# Altium schematic symbol library mastermind.SCHLIB: 732 symbols (part 2 of 5) (continued)
## GSM_SIM800C (continued)

## GSM_SIM800C_MODULE
designator U?, comment DeviceName: SIM800C  (hidden comment: SIM800C GSM/GPRS Module)
GateName_1: G$1; SymbolName_1: SIM900_LITERAL; DeviceSetName: GSM_SIM900_LITERAL; LibraryName: microbuilder; Package: SIM900_SMT; Parameter 1: *
footprint SIM800C_Module
pins: 1 5V, 2 VTTL, 3 GND, 4 TXD, 5 RXD, 6 DTR, 7 SPKRP, 8 SPKRN, 9 MICN, 10 MICP, 11 PI, 12 VRTC (power), 13 GND (power), 14 PWX, 15 GND, 16 VBAT

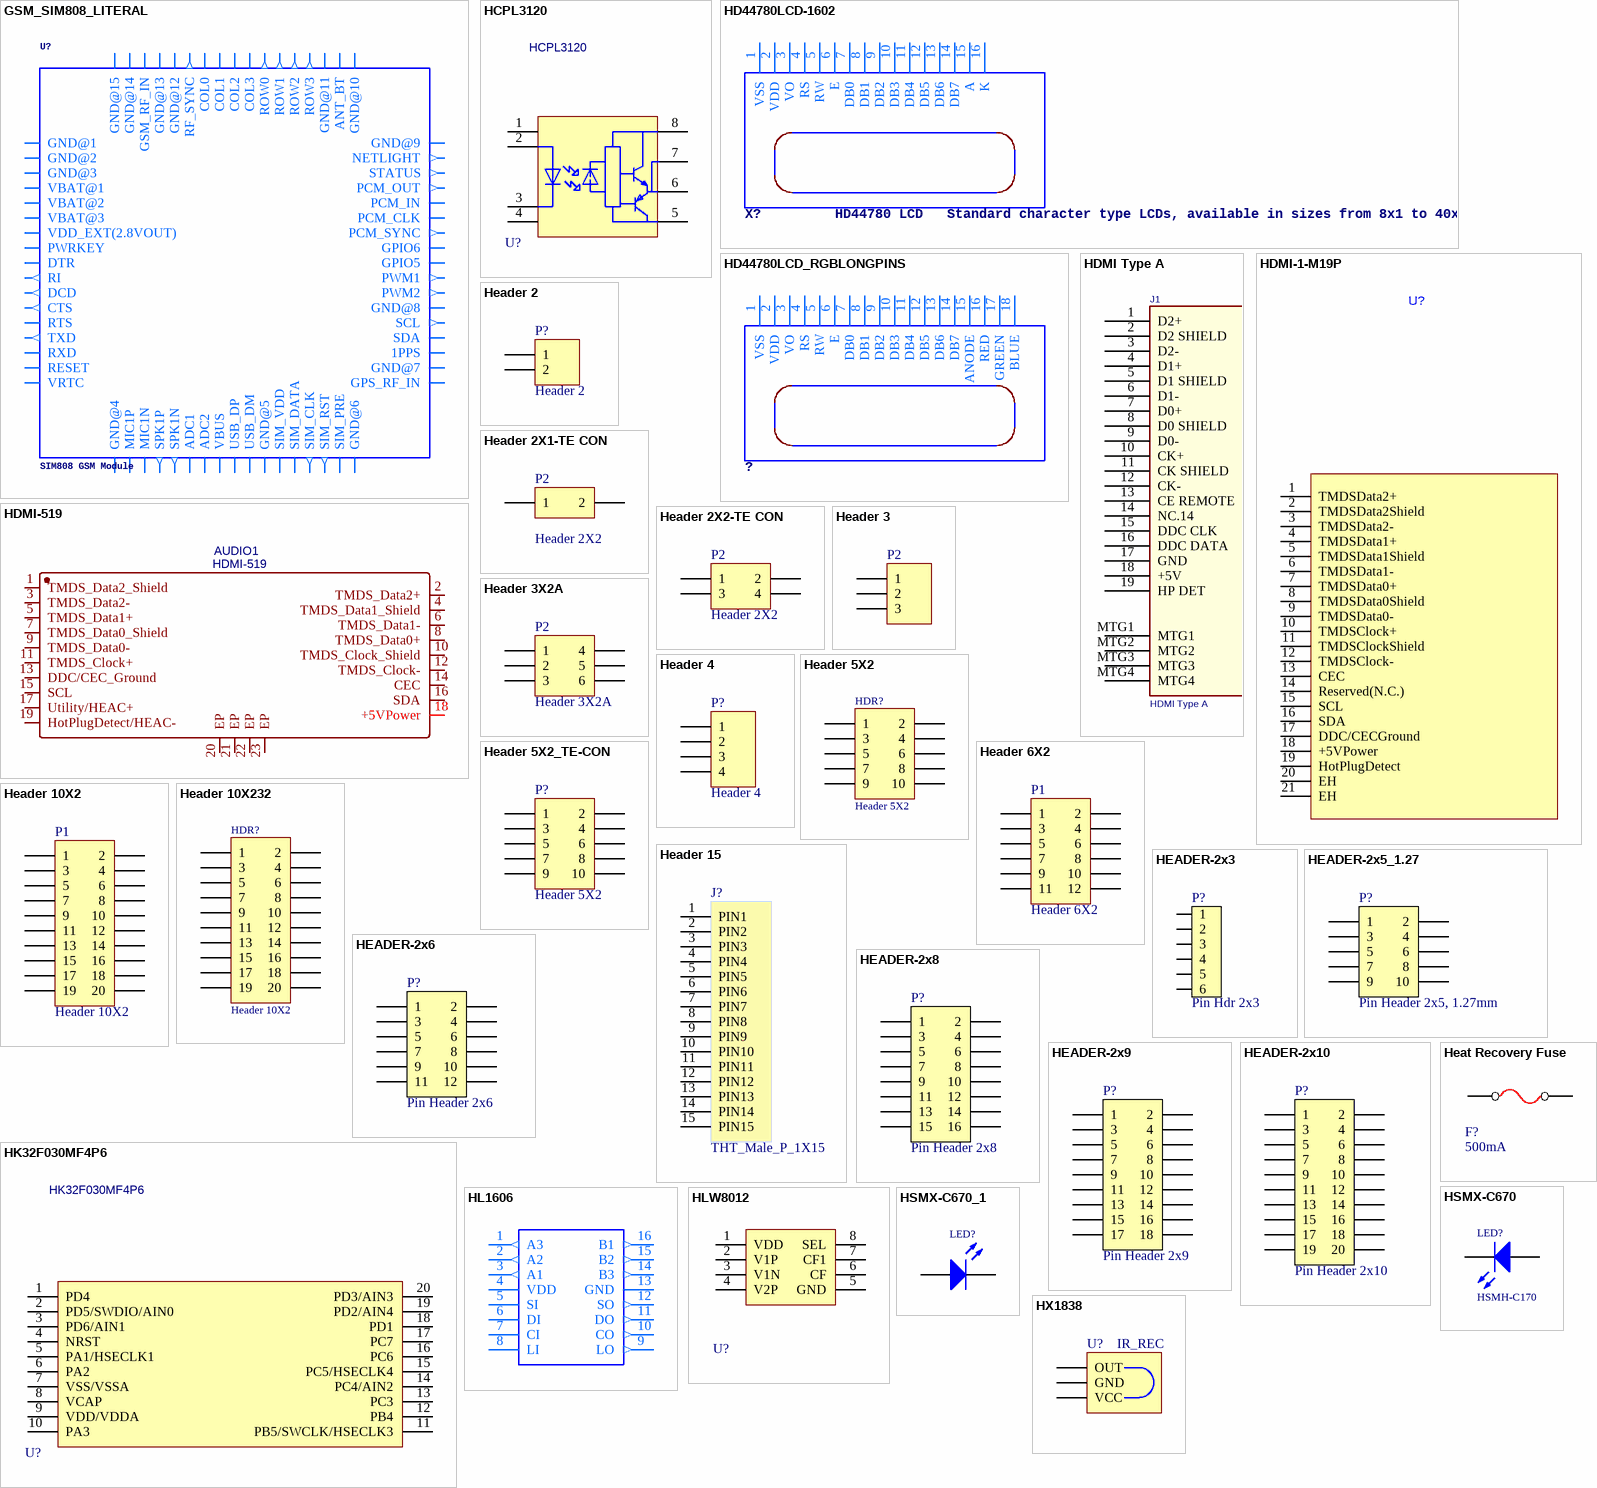
[diagram p12: symbols GSM_SIM808_LITERAL to HX1838]

## GSM_SIM808_LITERAL
designator U?, comment SIM808 GSM Module
footprint SIM900_SMT
pins: P$1 GND@1 (power), P$2 GND@2 (power), P$3 GND@3 (power), P$4 VBAT@1 (power), P$5 VBAT@2 (power), P$6 VBAT@3 (power), P$7 VDD_EXT(2.8VOUT) (power), P$8 PWRKEY, P$9 DTR, P$10 RI (out), P$11 DCD (out), P$12 CTS (out), P$13 RTS, P$14 TXD (out), P$15 RXD, P$16 RESET, P$17 VRTC (power), P$18 GND@4 (power), P$19 MIC1P, P$20 MIC1N, P$21 SPK1P (out), P$22 SPK1N (out), P$23 ADC1, P$24 ADC2, P$25 VBUS (power), P$26 USB_DP, P$27 USB_DM, P$28 GND@5 (power), P$29 SIM_VDD (power), P$30 SIM_DATA, P$31 SIM_CLK (out), P$32 SIM_RST (out), P$33 SIM_PRE, P$34 GND@6 (power), P$35 GPS_RF_IN, P$36 GND@7 (power), P$37 1PPS, P$38 SDA, P$39 SCL (out), P$40 GND@8 (power), P$41 PWM2 (out), P$42 PWM1 (out), P$43 GPIO5, P$44 GPIO6, P$45 PCM_SYNC (out), P$46 PCM_CLK, P$47 PCM_IN, P$48 PCM_OUT (out), P$49 STATUS (out), P$50 NETLIGHT (out), P$51 GND@9 (power), P$52 GND@10 (power), P$53 ANT_BT, P$54 GND@11 (power), P$55 ROW3 (out), P$56 ROW2 (out), P$57 ROW1 (out), P$58 ROW0 (out), P$59 COL3, P$60 COL2, P$61 COL1, P$62 COL0, P$63 RF_SYNC (out), P$64 GND@12 (power), P$65 GND@13 (power), P$66 GSM_RF_IN, P$67 GND@14 (power), P$68 GND@15 (power)

## HCPL3120
designator U?
Opto Gate Driver; Manufacturer: TOSHIBA; Manufacturer Part: TLP250(TP1,F); Supplier: LCSC; Supplier Part: C41664; spicePre: U; spiceSymbolName: TLP250(TP1,F)
footprint DIL08-ROUND
pins: 1, 2, 3, 4, 5 GND, 6, 7, 8 VCC

## HD44780LCD-1602
designator X?, comment HD44780 LCD   Standard character type LCDs, available in sizes from 8x1 to 40x4!
footprint LCD1602
pins: 1 VSS (oe), 2 VDD (oe), 3 VO, 4 RS, 5 RW, 6 E, 7 DB0, 8 DB1, 9 DB2, 10 DB3, 11 DB4, 12 DB5, 13 DB6, 14 DB7, 15 A, 16 K

## HD44780LCD_RGBLONGPINS
designator ?
footprint LCD1602-RGB
pins: 1 VSS (oe), 2 VDD (oe), 3 VO, 4 RS, 5 RW, 6 E, 7 DB0, 8 DB1, 9 DB2, 10 DB3, 11 DB4, 12 DB5, 13 DB6, 14 DB7, 15 ANODE, 16 RED, 17 GREEN, 18 BLUE

## HDMI Type A
designator J1
CONN RCPT 19POS HDMI RT ANG SMD; Manufacturer: Molex Connector Corporation; Manufacturer Part Number: 47151-0001; .Checked PCB: MM; Number of Positions: 19; Pitch: 0.50mm (.020"); Value: 47151-0001; Gender: Receptacle; .Version: V1.1 - Changed holes to slots; .Checked SCH: MM; Category: Connectors, Interconnects; Connector Type: HDMI; Family: USB, IEEE-1394 (Firewire), DVI, HDMI; Operating Temperature: -20°C to +85°C; Price 1k [$]: 1.74610; Supplier: Digikey; Supplier Part Number: WM19086CT-ND; Supplier 1: Digi-Key; Supplier Part Number 1: WM19086CT-ND; RoHS: RoHS Compliant; Stock 1: 2756; Pricing 1: 1=3.1, 10=2.57, 50=2.1456, 100=1.9034 (USD); Number of Contacts: 19; Specifications: -; Mounting Type: Surface Mount, Right Angle, Horizontal; Features: Detent Lock; Packaging: Cut Tape (CT); Ingress Protection: -; ComponentLink1URL: http://www.molex.com/pdm_docs/sd/471510001_sd.pdf; ComponentLink1Description: http://www.molex.com/pdm_docs/sd/471510001_sd.pdf
footprint HDMI Type-A
pins: 1 D2+, 2 D2 SHIELD, 3 D2-, 4 D1+, 5 D1 SHIELD, 6 D1-, 7 D0+, 8 D0 SHIELD, 9 D0-, 10 CK+, 11 CK SHIELD, 12 CK-, 13 CE REMOTE, 14 NC.14, 15 DDC CLK, 16 DDC DATA, 17 GND, 18 +5V, 19 HP DET, MTG1, MTG2, MTG3, MTG4

## HDMI-1-M19P
designator U?
footprint HDMI-SMD_BX-HDMI-1-M19P
pins: 1 TMDSData2+, 2 TMDSData2Shield, 3 TMDSData2-, 4 TMDSData1+, 5 TMDSData1Shield, 6 TMDSData1-, 7 TMDSData0+, 8 TMDSData0Shield, 9 TMDSData0-, 10 TMDSClock+, 11 TMDSClockShield, 12 TMDSClock-, 13 CEC, 14 Reserved(N.C.), 15 SCL, 16 SDA, 17 DDC/CECGround, 18 +5VPower, 19 HotPlugDetect, 20 EH, 21 EH

## HDMI-519
designator AUDIO1
Manufacturer: SOFNG(硕方); Contributor: LCSC; Supplier: LCSC; Supplier Part: C136421; Manufacturer Part: HDMI-519; JLCPCB Part Class: Extended Part; spicePre: A; spiceSymbolName: HDMI-519
footprint HDMI-SMD_19P-P0.40-H-F_HDMI-519
pins: 1 TMDS_Data2_Shield, 2 TMDS_Data2+, 3 TMDS_Data2-, 4 TMDS_Data1_Shield, 5 TMDS_Data1+, 6 TMDS_Data1-, 7 TMDS_Data0_Shield, 8 TMDS_Data0+, 9 TMDS_Data0-, 10 TMDS_Clock_Shield, 11 TMDS_Clock+, 12 TMDS_Clock-, 13 DDC/CEC_Ground, 14 CEC, 15 SCL, 16 SDA, 17 Utility/HEAC+, 18 +5VPower, 19 HotPlugDetect/HEAC-, 20 EP, 21 EP, 22 EP, 23 EP

## Header 2
designator P?
Header, 2-Pin; LatestRevisionDate: 17-Jul-2002; LatestRevisionNote: Re-released for DXP Platform.; Publisher: Altium Limited
footprint HDR1X2 (Connector; Header; 2 Position)
pins: 1, 2

## Header 2X1-TE CON
designator P2, comment Header 2X2
Header, 2-Pin, Dual row; LatestRevisionDate: 17-Jul-2002; LatestRevisionNote: Re-released for DXP Platform.; Publisher: Altium Limited
footprint HDR2X1-TE-CON (Connector; Header; 5x2 Position)
pins: 1, 2

## Header 2X2-TE CON
designator P2, comment Header 2X2
Header, 2-Pin, Dual row; LatestRevisionDate: 17-Jul-2002; LatestRevisionNote: Re-released for DXP Platform.; Publisher: Altium Limited
footprint HDR2X2-TE-CON (Connector; Header; 5x2 Position)
pins: 1, 2, 3, 4

## Header 3
designator P2  (value not drawn)
Header, 3-Pin; LatestRevisionDate: 17-Jul-2002; LatestRevisionNote: Re-released for DXP Platform.; Publisher: Altium Limited
footprint HDR1X3 (Connector; Header; 3 Position)
signal-integrity model Connector
footprint HDR1X3 - JUMP (Connector; Header; 3 Position)
pins: 1, 2, 3

## Header 3X2A
designator P2
Header, 3-Pin, Dual row; LatestRevisionDate: 17-Jul-2002; LatestRevisionNote: Re-released for DXP Platform.; Publisher: Altium Limited
signal-integrity model Connector
footprint HDR_2x3-SMD - 2.0
footprint HDR_2x3-SMD-2.54
footprint HDR2X3_1MM (Connector; Header; 3x2 Position)
pins: 1, 2, 3, 4, 5, 6

## Header 4
designator P?
Header, 4-Pin; LatestRevisionDate: 17-Jul-2002; LatestRevisionNote: Re-released for DXP Platform.; Publisher: Altium Limited
footprint JST-PH-4-THM
footprint 4PIN_SMD
footprint HDR1X4 (Connector; Header; 4 Position)
footprint HDR1X4 - 2mm (Connector; Header; 4 Position)
pins: 1, 2, 3, 4

## Header 5X2
designator HDR?
Header, 5-Pin, Dual row; Revision: 17-Jul-2002: Re-released for DXP Platform.
footprint HDR2X5_LP
signal-integrity model Connector
3D model 10_pin_box_male (PCB3D Model)
footprint DIP10_2SIDED
footprint IDC10_2SIDED
pins: 1, 2, 3, 4, 5, 6, 7, 8, 9, 10

## Header 5X2_TE-CON
designator P?, comment Header 5X2
Header, 5-Pin, Dual row TE  Connectivity; LatestRevisionDate: 17-Jul-2002; LatestRevisionNote: Re-released for DXP Platform.; Publisher: Altium Limited
footprint HDR2X5 (Connector; Header; 5x2 Position)
signal-integrity model Connector
pins: 1, 2, 3, 4, 5, 6, 7, 8, 9, 10

## Header 6X2
designator P1
Header, 6-Pin, Dual row; LatestRevisionDate: 17-Jul-2002; LatestRevisionNote: Re-released for DXP Platform.; Publisher: Altium Limited
footprint HDR2X6 (Connector; Header; 6x2 Position)
signal-integrity model Connector
footprint DIP12_2sided
footprint HDR_2x6 - SMD - 2.0
footprint HDR_2x6 - SMD - 2.54
footprint HDR2X6_2mm (Connector; Header; 6x2 Position)
pins: 1, 2, 3, 4, 5, 6, 7, 8, 9, 10, 11, 12

## Header 10X2
designator P1
Header, 10-Pin, Dual row; LatestRevisionDate: 17-Jul-2002; LatestRevisionNote: Re-released for DXP Platform.; Publisher: Altium Limited
footprint HDR2X10
signal-integrity model Connector
pins: 1, 2, 3, 4, 5, 6, 7, 8, 9, 10, 11, 12, 13, 14, 15, 16, 17, 18, 19, 20

## Header 10X232
designator HDR?, comment Header 10X2
Header, 10-Pin, Dual row; Revision: July-2002: Re-released for DXP Platform.
footprint HDR2X10
signal-integrity model Connector
3D model HDR10X2 (PCB3D Model)
pins: 1, 2, 3, 4, 5, 6, 7, 8, 9, 10, 11, 12, 13, 14, 15, 16, 17, 18, 19, 20

## Header 15
designator J?  Name: THT_Male_P_1X15
Header, 15-Pin; LatestRevisionDate: 17-Jul-2002; LatestRevisionNote: Re-released for DXP Platform.; Publisher: Altium Limited
footprint HDR1X15 (Connector; Header; 15 Position)
signal-integrity model Connector
pins: 1 PIN1, 2 PIN2, 3 PIN3, 4 PIN4, 5 PIN5, 6 PIN6, 7 PIN7, 8 PIN8, 9 PIN9, 10 PIN10, 11 PIN11, 12 PIN12, 13 PIN13, 14 PIN14, 15 PIN15

## HEADER-2x3
designator P?, comment Pin Hdr 2x3
Pin Header 2x3, 2.54mm (100mil) SMD; Part Number: Pin Header 2x3 SMD; Manufacturer: WCON; Manufacturer Part Number: 1125-1203S0M116R1; 2nd source part number: TSM-103-01-L-DV; Artikkelnr Noca: 55010007; Artikkelnr Simpro: N.A.; Datasheet: \\hizz\pro\app9717\Datasheet\connectores\W-CON\1125-12XXXXMXXXXX.PDF; Footprint Doc: HDR_2x3-SMD; LatestRevisionDate: 2016-01-22; Pin Count: 6; Publisher: Nordic Semiconductor; Published: 2016-01-22; Value: Pin Hdr 2x3; Note: SMD; Supplier: Cabcon; Supplier part number: 1125-1203S0M116R1; 2nd source Supplier: Samtec
footprint HDR_2x3-SMD
pins: 1, 2, 3, 4, 5, 6

## HEADER-2x5_1.27
designator P?, comment Pin Header 2x5, 1.27mm
Pin Header 2x5, 1.27mm (50mil), SMD, Keying Shroud; Part Number: Pin Header 2x5 SMD, 1.27mm, KS; Manufacturer: WCON; Manufacturer Part Number: 3132-10MS0BK00R1; 2nd source part number: FTSH-105-01-F-DV-K; Artikkelnr Noca: 55010009; Artikkelnr Simpro: N.A.; Datasheet: \\hizz\pro\app9717\Datasheet\connectores\W-CON\3132-XXMXXBK00XX.pdf; Footprint Doc: HDR_2x5-SMD-1.27mm; LatestRevisionDate: 2016-04-21; Pin Count: 10; Publisher: Nordic Semiconductor; Published: 2016-01-22; Value: Pin Header 2x5, 1.27mm; Note: *; Supplier: Cabcon; Supplier part number: 3132-10MS0BK00R1; 2nd source Supplier: Samtec
footprint HDR_2x5-SMD-1.27mm-K
pins: 1, 2, 3, 4, 5, 6, 7, 8, 9, 10

## HEADER-2x6
designator P?, comment Pin Header 2x6
Pin Header 2x6, 2.54mm (100mil); Note: Not mounted; Artikkelnr Noca: N.A.; Part Number: Pin Header 2x6; Manufacturer: *; Manufacturer Part Number: *; Datasheet: *; Footprint Doc: HDR_2x6; LatestRevisionDate: 2014-07-04; Pin Count: 12; Publisher: Nordic Semiconductor; Published: 2009-12-12; Value: Pin Header 2x6; Supplier: *; Supplier part number: *; 2nd source Supplier: *; 2nd source part number: *; Artikkelnr Simpro: N.A.
footprint HDR_2x6
pins: 1, 2, 3, 4, 5, 6, 7, 8, 9, 10, 11, 12

## HEADER-2x8
designator P?, comment Pin Header 2x8
Pin Header 2x8, 2.54mm (100mil); Note: Not mounted; Artikkelnr Noca: N.A.; Part Number: Pin Header 2x8; Manufacturer: *; Manufacturer Part Number: *; Datasheet: *; Footprint Doc: HDR_2x8; LatestRevisionDate: 2009-12-12; Pin Count: 16; Publisher: Nordic Semiconductor; Published: 2009-12-12; Value: Pin Header 2x8; Supplier: *; Supplier part number: *; 2nd source Supplier: *; 2nd source part number: *; Artikkelnr Simpro: N.A.
footprint HDR_2x8
pins: 1, 2, 3, 4, 5, 6, 7, 8, 9, 10, 11, 12, 13, 14, 15, 16

## HEADER-2x9
designator P?, comment Pin Header 2x9
Pin Header 2x9, 2.54mm (100mil); Artikkelnr Noca: N.A.; Part Number: Pin Header 2x9; Manufacturer: *; Manufacturer Part Number: *; Datasheet: *; Footprint Doc: HDR_2x9; LatestRevisionDate: 2011-07-06; Pin Count: 18; Publisher: Nordic Semiconductor; Published: 2011-07-06; Value: Pin Header 2x9; Note: *; Supplier: *; Supplier part number: *; 2nd source Supplier: *; 2nd source part number: *; Artikkelnr Simpro: N.A.
footprint HDR_2x9
pins: 1, 2, 3, 4, 5, 6, 7, 8, 9, 10, 11, 12, 13, 14, 15, 16, 17, 18

## HEADER-2x10
designator P?, comment Pin Header 2x10
Pin Header 2x10, 2.54mm (100mil); Note: Not mounted; Artikkelnr Noca: N.A.; Part Number: Pin Header 2x10; Manufacturer: *; Manufacturer Part Number: *; Datasheet: *; Footprint Doc: HDR_2x10; LatestRevisionDate: 2014-07-04; Pin Count: 20; Publisher: Nordic Semiconductor; Published: 2009-12-12; Value: Pin Header 2x10; Supplier: *; Supplier part number: *; 2nd source Supplier: *; 2nd source part number: *; Artikkelnr Simpro: N.A.
footprint HDR_2x10
pins: 1, 2, 3, 4, 5, 6, 7, 8, 9, 10, 11, 12, 13, 14, 15, 16, 17, 18, 19, 20

## Heat Recovery Fuse
designator F?  value 500mA
footprint 0411V
footprint FUSE
footprint FUSE - Long
footprint 0207/2V
footprint Fuse-SMD
footprint 1812
footprint R1206-NO
pins: 1, 2

## HK32F030MF4P6
designator U?
Manufacturer: HK(航顺); Contributor: LCSC; Supplier: LCSC; Supplier Part: C707444; Manufacturer Part: HK32F030MF4P6; JLCPCB Part Class: Extended Part; spicePre: U; spiceSymbolName: HK32F030MF4P6
footprint TSSOP-20_L6.5-W4.4-P0.65-LS6.4-BL
pins: 1 PD4, 2 PD5/SWDIO/AIN0, 3 PD6/AIN1, 4 NRST, 5 PA1/HSECLK1, 6 PA2, 7 VSS/VSSA, 8 VCAP, 9 VDD/VDDA, 10 PA3, 11 PB5/SWCLK/HSECLK3, 12 PB4, 13 PC3, 14 PC4/AIN2, 15 PC5/HSECLK4, 16 PC6, 17 PC7, 18 PD1, 19 PD2/AIN4, 20 PD3/AIN3

## HL1606
designator ?
footprint SO16
pins: 1 A3 (out), 2 A2 (out), 3 A1 (out), 4 VDD (power), 5 SI, 6 DI, 7 CI, 8 LI, 9 LO (out), 10 CO (out), 11 DO (out), 12 SO (out), 13 GND (power), 14 B3 (out), 15 B2 (out), 16 B1 (out)

## HLW8012
designator U?
footprint SOP8
pins: 1 VDD (power), 2 V1P, 3 V1N, 4 V2P, 5 GND, 6 CF, 7 CF1, 8 SEL (power)

## HSMX-C670
designator LED?, comment HSMH-C170
Typical RED GaAs SMD LED Agilent make; AEMS Code: 2610081; Revision: July-2002: Re-released for DXP Platform.
footprint SMD _LED
simulation model LED1 (Diode)
3D model LED (PCB3D Model)
pins: 1 A, 2 K

## HSMX-C670_1
designator LED?, comment HSMH-C170  (value not drawn)
Typical RED GaAs SMD LED Agilent make; AEMS Code: 2610081; Revision: July-2002: Re-released for DXP Platform.
footprint SMD _LED
simulation model LED1 (Diode)
3D model LED (PCB3D Model)
pins: 1 A, 2 K

## HX1838
designator U?
Header, 3-Pin; LatestRevisionDate: 17-Jul-2002; LatestRevisionNote: Re-released for DXP Platform.; Publisher: Altium Limited
footprint ISO203 (Connector; Header; 3 Position)
pins: 1 OUT, 2 GND, 3 VCC
text: IR_REC

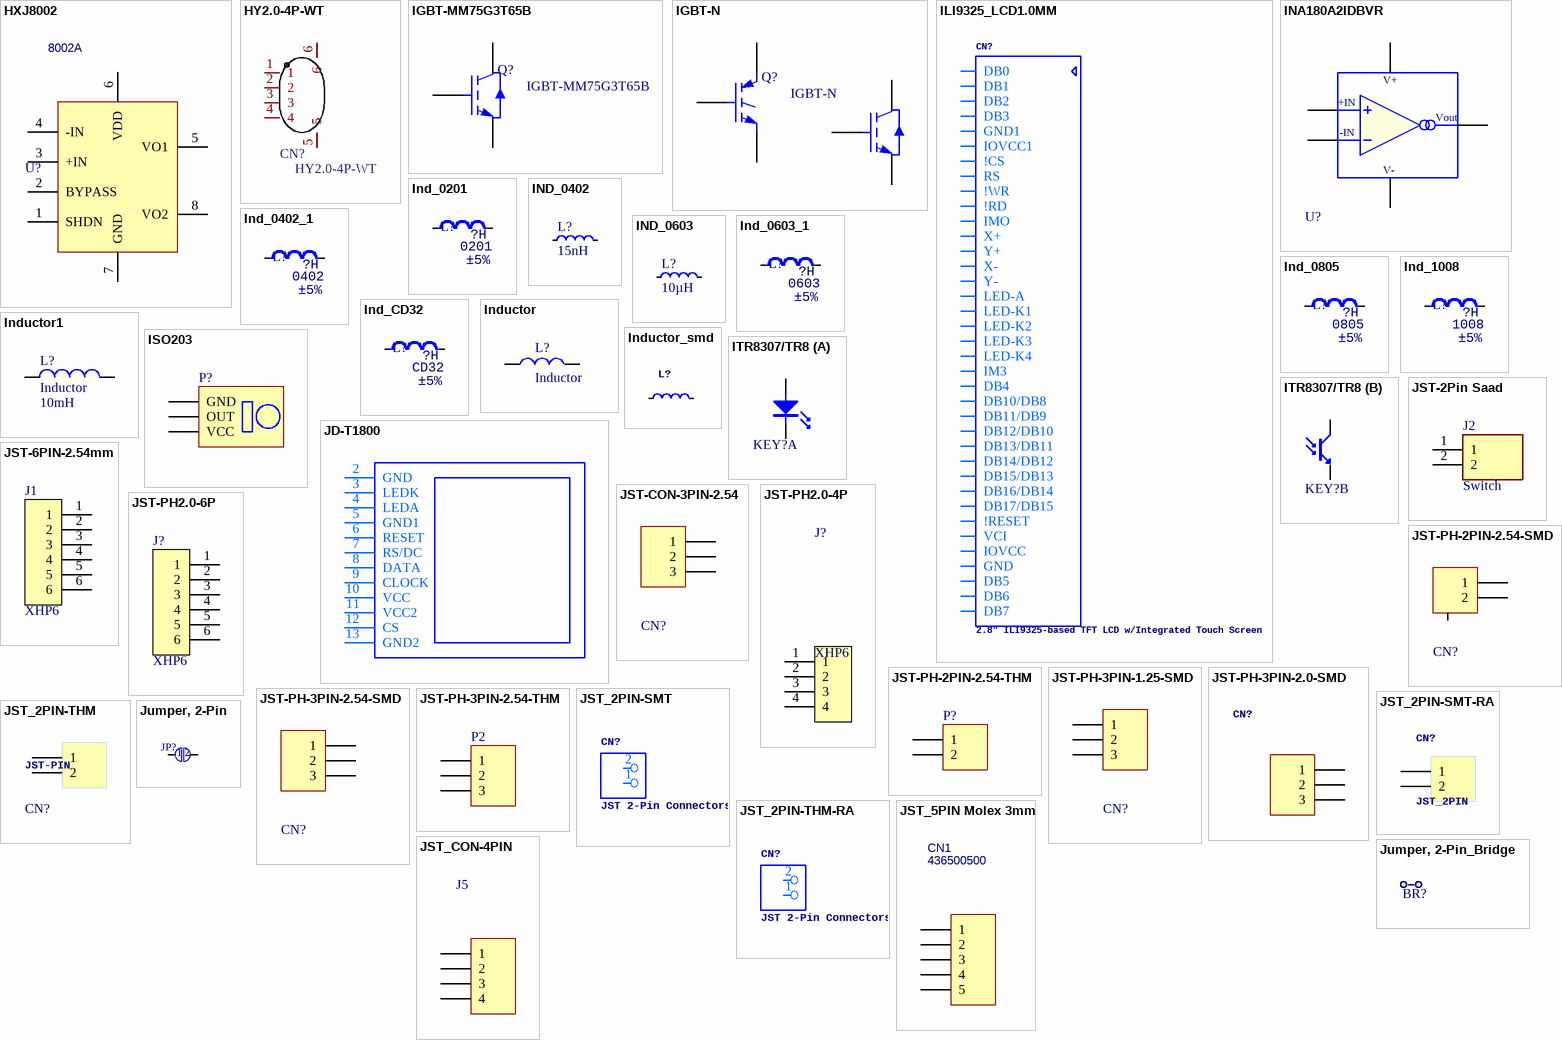
[diagram p13: symbols HXJ8002 to Jumper, 2-Pin_Bridge]

## HXJ8002
designator U?, comment 8002A
Manufacturer: IDCHIP(英锐芯); Contributor: LCSC; Supplier: LCSC; Supplier Part: C329448; Manufacturer Part: 8002A; JLCPCB Part Class: Extended Part; spicePre: U; spiceSymbolName: 8002A
footprint SOIC-8E (SOIC, 8-Leads, Body 4.90x3.90mm, Pitch 1.27mm, IPC Medium Density)
pins: 1 SHDN, 2 BYPASS, 3 +IN, 4 -IN, 5 VO1, 6 VDD, 7 GND, 8 VO2

## HY2.0-4P-WT
designator CN?
Manufacturer: CAX(创都); Add into BOM: yes; Pins Structure: 1x4P; Pitch: 2mm; Number of PINs Per Row: 4; Symbol: HY2.0-4P-WT; Device: HY2.0-4P-WT; Supplier: LCSC; Supplier Part: C722729; Manufacturer Part: HY2.0-4P-WT; JLCPCB Part Class: Extended Part; LCSC Part Name: 1x4P 间距:2mm 卧贴; Supplier Footprint: SMD,P=2mm,卧贴; Datasheet: https://atta.szlcsc.com/upload/public/pdf/source/20200903/C722727_BBF50559C2ABBA609D4F52DD7C381BF6.pdf; Convert to PCB: yes; Mounting Style: 卧贴; Reference Series: -; Number of Pins: 4P; Number of Rows: 1; Row Spacing: -; Current Rating (Max): -; Operating Temperature Range: -
footprint CONN-SMD_HY2.0-4P
pins: 1, 2, 3, 4, 5, 6

## IGBT-MM75G3T65B
designator Q?
N-Channel  650V 75A; Published: 8-Jun-2000; LatestRevisionDate: 17-Jul-2002; LatestRevisionNote: Re-released for DXP Platform.; DatasheetVersion: PD-9.684A; PackageReference: TO-247; Publisher: Altium Limited; PackageDescription: SIP with Mounting Hole; 3 Leads; Body 20 x 15.6 x 5 mm (typ); Pitch 5.45 mm; Code_JEDEC: TO-247-AC; ComponentLink1Description: Manufacturer Link; ComponentLink1URL: http://www.irf.com/
footprint TO-247 (SIP with Mounting Hole; 3 Leads; Body 20 x 15.6 x 5 mm (typ); Pitch 5.45 mm)
pins: 1 G, 2 C, 3 E

## IGBT-N
designator Q?
Insulated Gate Bipolar Transistor (N-Channel); Published: 8-Jun-2000; LatestRevisionDate: 17-Jul-2002; LatestRevisionNote: Re-released for DXP Platform.; DatasheetVersion: PD-9.684A; PackageReference: TO-247; Publisher: Altium Limited; PackageDescription: SIP with Mounting Hole; 3 Leads; Body 20 x 15.6 x 5 mm (typ); Pitch 5.45 mm; Code_JEDEC: TO-247-AC; ComponentLink1Description: Manufacturer Link; ComponentLink1URL: http://www.irf.com/
pins: 1 G, 1 G, 2 C, 2 C, 3 E, 3 E

## ILI9325_LCD1.0MM
designator CN?, comment 2.8" ILI9325-based TFT LCD w/Integrated Touch Screen
footprint ILI9325_28INCH_TS
pins: 1 DB0, 2 DB1, 3 DB2, 4 DB3, 5 GND1 (power), 6 IOVCC1 (power), 7 !CS, 8 RS, 9 !WR, 10 !RD, 11 IMO, 12 X+, 13 Y+, 14 X-, 15 Y-, 16 LED-A, 17 LED-K1, 18 LED-K2, 19 LED-K3, 20 LED-K4, 21 IM3, 22 DB4, 23 DB10/DB8, 24 DB11/DB9, 25 DB12/DB10, 26 DB13/DB11, 27 DB14/DB12, 28 DB15/DB13, 29 DB16/DB14, 30 DB17/DB15, 31 !RESET, 32 VCI (power), 33 IOVCC (power), 34 GND (power), 35 DB5, 36 DB6, 37 DB7

## INA180A2IDBVR
designator U?, comment Shunt Current  (value not drawn)
footprint SOT23-6
pins: 1 OA, 2 GND, 3 A+, 4 A-, 5 VCC
text: V+; +IN; Vout; -IN; V-

## Ind_0201
designator L?, comment value ?H  Note: ±5%  Type: 0201  (hidden comment: H0201)
Inductor; Specification: High frequency chip inductor ±5%; Manufacturer: *
footprint IND_0201
pins: 1, 2

## IND_0402
designator L?, comment 15nH
Inductor, 320mA, ±5%; Part Number: L0402-15n; Manufacturer: Taiyo Yuden; Manufacturer Part Number: HK100515NJ-T; 2nd source part number: 658-1328; Note: High frequency chip inductor ±10%; Artikkelnr Noca: 33029323; Artikkelnr Simpro: N.A.; LatestRevisionDate: 2012-09-19; Pin Count: 2; Publisher: Nordic Semiconductor; Published: 2010-07-12; Value: 15nH; Supplier: Digi-Key; Datasheet: http://www.yuden.co.jp/productdata/catalog/en/mlci04_e.pdf; Supplier part number: 587-1521-1-ND; 2nd source Supplier: Farnell; Footprint Doc: 0402
footprint INDC1005X04L
pins: 1, 2

## Ind_0402_1
designator L?, comment value ?H  Note: ±5%  Type: 0402  (hidden comment: H0402)
Inductor; Specification: High frequency chip inductor ±5%; Manufacturer: *
footprint IND_0402
pins: 1, 2

## IND_0603
designator L?, comment 10µH
Inductor, 80mA, ±10%; Part Number: L0603-10µ; Manufacturer: Taiyo Yuden; Manufacturer Part Number: LBMF1608T100K; 2nd source part number: 178-6105; Note: LBMF1608T100K 10µH 80mA 0603; Artikkelnr Noca: 33029314; Artikkelnr Simpro: N.A.; Datasheet: http://www.yuden.co.jp/ut/product/pdf/elb2_e.pdf; LatestRevisionDate: 2012-09-19; Pin Count: 2; Publisher: Nordic Semiconductor; Published: 2010-02-24; Value: 10µH; Supplier: Digi-Key; Supplier part number: 587-1714-1-ND; 2nd source Supplier: Farnell; Footprint Doc: 0603
footprint INDC1608X06L
pins: 1, 2

## Ind_0603_1
designator L?, comment value ?H  Note: ±5%  Type: 0603  (hidden comment: H0603)
Inductor; Specification: High frequency chip inductor ±5%; Manufacturer: *
footprint IND_0603
pins: 1, 2

## Ind_0805
designator L?, comment value ?H  Note: ±5%  Type: 0805  (hidden comment: H0805)
Inductor; Specification: High frequency chip inductor ±5%; Manufacturer: *
footprint IND_0805
pins: 1, 2

## Ind_1008
designator L?, comment value ?H  Note: ±5%  Type: 1008  (hidden comment: H1008)
Inductor; Specification: High frequency chip inductor ±5%; Manufacturer: *
footprint IND_1008
pins: 1, 2

## Ind_CD32
designator L?, comment value ?H  Note: ±5%  (hidden comment: CD32)
Power Inductor; Specification: High frequency chip inductor ±5%; Manufacturer: *; Type: CD32
footprint IND_CD32
pins: 1, 2

## Inductor
designator L?
footprint I1206K - Inductor
footprint 82114R
footprint 0207/2V
footprint INDUCTOR_4X4MM_SMD
footprint INDUCTOR_7X7MM_SMD
footprint INDUCTOR_10X10MM_SMD - duplicate
footprint IND-SMD_L6.0-W6.0
footprint IND-SMD_L12.3-W12.3
footprint IND-SMD_L4.0-W4.0_SMNR4020
footprint TORIDAL-D27_W13
footprint TORIDAL-L48_W34
footprint TORIDAL-L66_W50
pins: 1, 2

## Inductor1
designator L?, comment Inductor  value 10mH
Code_IEC: 1005; Published: 8-Jun-2000; LatestRevisionDate: 29-May-2009; LatestRevisionNote: IPC-7351 Footprint Added.; PackageReference: 0402-A; Publisher: Altium Limited; PackageDescription: Chip Inductor; Code_JEITA: 0402
footprint 0402-A (Chip Inductor, Body 1.0x0.5mm, IPC High Density)
footprint INDC1608L (Chip Inductor, Body 1.6x0.8mm, IPC High Density)
footprint 2029 (Chip Inductor, Body 2.0x1.2mm, IPC High Density)
footprint 0603 (Chip Inductor, Body 0.6x0.3mm, IPC High Density)
footprint INDC3216 (Chip Inductor, Body 3.2x1.6mm, IPC High Density)
footprint INDC4532 (Chip Inductor, Body 4.5x3.2mm, IPC High Density)
simulation model INDUCTOR (Inductor)
signal-integrity model Inductor
pins: 1, 2

## Inductor_smd
designator L?, comment Chip inductor  (value not drawn)
footprint INDC-0603
pins: 1, 2

## ISO203
designator P?
Header, 3-Pin; LatestRevisionDate: 17-Jul-2002; LatestRevisionNote: Re-released for DXP Platform.; Publisher: Altium Limited
footprint ISO203 (Connector; Header; 3 Position)
pins: 1 GND, 2 OUT, 3 VCC

## ITR8307/TR8
designator KEY?  (value not drawn)
Manufacturer: EVERLIGHT(亿光); Supplier: LCSC; Manufacturer Part: ITR8307/TR8; Supplier Part: C67922; JLCPCB Part Class: Extended Part; spicePre: K; spiceSymbolName: ITR8307/TR8
footprint OPTO-4P-L3.4-W2.7-P1.30-LS4.6
part A pins: 1 K "Cathode", 2 A "Anode"
part B pins: 3 C "Collector", 4 E "Emitter"

## JD-T1800
designator LCD?
footprint JD-T1800
pins: 2 GND (power), 3 LEDK, 4 LEDA, 5 GND1 (power), 6 RESET, 7 RS/DC, 8 DATA, 9 CLOCK, 10 VCC (power), 11 VCC2 (power), 12 CS, 13 GND2 (power)

## JST-2Pin Saad
designator J2, comment Switch
Connector Header Through Hole 2 position 0.098 (2.50mm); DETAILS: Connector Header Through Hole 2 position 0.098" (2.50mm); MFG: JST Sales America Inc.; MFGPN: B2B-XH-A(LF)(SN); PACKAGE: CONN HEADER VERT 2POS 2.5MM; URL: https://www.digikey.com/en/products/detail/jst-sales-america-inc/B2B-XH-A-LF-SN/1651045?s=N4IgTCBcDaIEJjgWgBoAkkEEAUAZAYgJTYDKAcoSALoC%2BQA
footprint JST_B2B-XH-A(LF)(SN)
pins: 1, 2

## JST-6PIN-2.54mm
designator J1, comment XHP6
footprint JST_B6B-XH-A(LF)(SN)
pins: 1, 2, 3, 4, 5, 6

## JST-CON-3PIN-2.54
designator CN?, comment ZX-XH2.54-3PWT  (value not drawn)
Manufacturer: Megastar(兆星); Contributor: lcsc; Supplier: LCSC; Supplier Part: C7429672; Manufacturer Part: ZX-XH2.54-3PWT; JLCPCB Part Class: Extended Part; spicePre: C; spiceSymbolName: ZX-XH2.54-3PWT
footprint JST_B3B-XH-A(LF)(SN)
pins: 1, 2, 3

## JST-PH2.0-4P
designator J?, comment XHP6
footprint JST-PH2.0-4PINS
pins: 1, 2, 3, 4

## JST-PH2.0-6P
designator J?, comment XHP6
footprint JST-PH2.0-6PINS
pins: 1, 2, 3, 4, 5, 6

## JST-PH-2PIN-2.54-SMD
designator CN?, comment ZX-XH2.54-2PWT  (value not drawn)
Manufacturer: Megastar(兆星); Contributor: lcsc; Supplier: LCSC; Supplier Part: C7429671; Manufacturer Part: ZX-XH2.54-2PWT; JLCPCB Part Class: Extended Part; spicePre: C; spiceSymbolName: ZX-XH2.54-2PWT
footprint CONN-SMD_2P-P2.54_MEGASTAR_ZX-XH2.54-2PWT
pins: 1, 2, M

## JST-PH-2PIN-2.54-THM
designator P?, comment Header 2  (value not drawn)
Header, 2-Pin; LatestRevisionDate: 17-Jul-2002; LatestRevisionNote: Re-released for DXP Platform.; Publisher: Altium Limited
footprint JST-PH-2PIN-2.54-THM
pins: 1, 2

## JST-PH-3PIN-1.25-SMD
designator CN?, comment ZX-XH2.54-3PWT  (value not drawn)
Manufacturer: Megastar(兆星); Contributor: lcsc; Supplier: LCSC; Supplier Part: C7429672; Manufacturer Part: ZX-XH2.54-3PWT; JLCPCB Part Class: Extended Part; spicePre: C; spiceSymbolName: ZX-XH2.54-3PWT
footprint CONN-TH_SM03B-GHS-TB-LF-SN
pins: 1, 2, 3, 4 GND hidden to GND, 5 GND hidden to GND

## JST-PH-3PIN-2.0-SMD
designator CN?
footprint JSTPH3
pins: 1, 2, 3

## JST-PH-3PIN-2.54-SMD
designator CN?, comment ZX-XH2.54-3PWT  (value not drawn)
Manufacturer: Megastar(兆星); Contributor: lcsc; Supplier: LCSC; Supplier Part: C7429672; Manufacturer Part: ZX-XH2.54-3PWT; JLCPCB Part Class: Extended Part; spicePre: C; spiceSymbolName: ZX-XH2.54-3PWT
footprint CONN-SMD_3P-P2.54-XH2.54-WT
pins: 1, 2, 3, M GND hidden

## JST-PH-3PIN-2.54-THM
designator P2, comment Header 3  (value not drawn)
Header, 3-Pin; LatestRevisionDate: 17-Jul-2002; LatestRevisionNote: Re-released for DXP Platform.; Publisher: Altium Limited
footprint JST-PH-3PIN-2.54-THM
pins: 1, 2, 3

## JST_2PIN-SMT
designator CN?, comment JST 2-Pin Connectors of various flavors SMT-RA (S2B-PH-SM4) 4UConnector #17311  SMT  (B2B-PH-SM4)  THM-RA (S2B-PH)  THM  (B2B-PH)
footprint JST-PH-2-SMT
pins: 1 2, 2 1

## JST_2PIN-SMT-RA
designator CN?, comment JST_2PIN
JST 2-Pin Connectors of various flavors SMT-RA (S2B-PH-SM4) 4UConnector #17311  SMT  (B2B-PH-SM4)  THM-RA (S2B-PH)  THM  (B2B-PH)
footprint JST-PH-2-SMT-RA
pins: 1, 2

## JST_2PIN-THM
designator CN?, comment JST-PIN
footprint JST-2-PTH-THM - VERTICAL
pins: 1, 2

## JST_2PIN-THM-RA
designator CN?, comment JST 2-Pin Connectors of various flavors SMT-RA (S2B-PH-SM4) 4UConnector #17311  SMT  (B2B-PH-SM4)  THM-RA (S2B-PH)  THM  (B2B-PH)
footprint JST-PH-2-THM-RA
pins: 1 2, 2 1

## JST_5PIN Molex 3mm
designator CN1, comment 436500500
BOM_Manufacturer: MOLEX; Contributor: LCSC; BOM_Supplier: LCSC; BOM_Supplier Part: C492351; BOM_Manufacturer Part: 436500500; BOM_JLCPCB Part Class: Extended Part; spicePre: C; spiceSymbolName: 436500500
footprint CONN-TH_436500500
pins: 1, 2, 3, 4, 5

## JST_CON-4PIN
designator J5
4 Position Wire to Board Terminal Block Horizontal with Board 0.100 _2.54mm_ Through Hole; DETAILS: Connector Header Through Hole 4 position 0.098" (2.50mm); MFG: JST Sales America Inc.; MFGPN: B4B-XH-A(LF)(SN); PACKAGE: 4POS 2.5MM; URL: https://www.digikey.com/en/products/detail/jst-sales-america-inc/B4B-XH-A-LF-SN/1651047
footprint JST_B4B-XH-A(LF)(SN)
pins: 1, 2, 3, 4

## Jumper, 2-Pin
designator JP?, comment GND  (value not drawn)  (no BOM)
Jumper, 2-Pin
footprint JUMPER-SB
footprint Jumper-NO
pins: 1, 2

## Jumper, 2-Pin_Bridge
designator BR?  (value not drawn)  (no BOM)
Jumper, 2-Pin
signal-integrity model Connector
footprint JUMPER-NT
pins: 1, 2

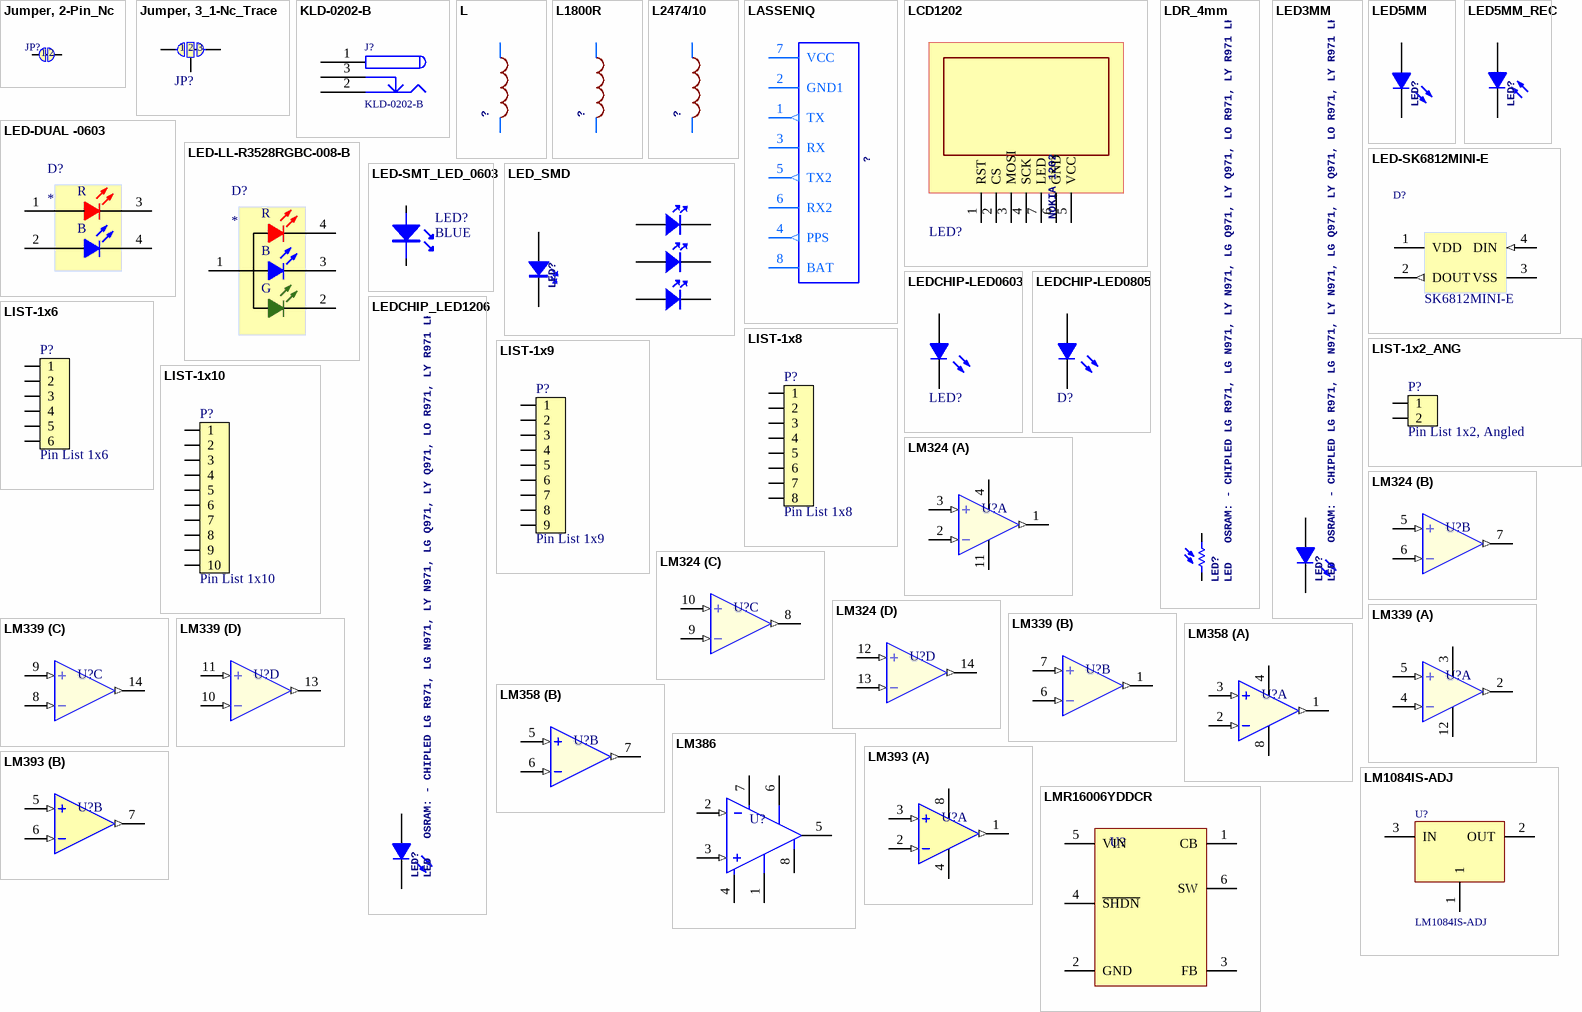
[diagram p14: symbols Jumper, 2-Pin_Nc to LMR16006YDDCR]

## Jumper, 2-Pin_Nc
designator JP?, comment Shorting Link  (value not drawn)  (no BOM)
Jumper, 2-Pin
footprint Jumper-NC
pins: 1, 2

## Jumper, 3_1-Nc_Trace
designator JP?, comment JUMPER-SMT_3_1-NC_TRACE_NO-SILK  (value not drawn)  (no BOM)
GateName_1: G$1; SymbolName_1: SMT-JUMPER_3_1-NC_TRACE; DeviceName: _NO-SILK; LibraryName: SparkFun-Jumpers; DeviceSetName: JUMPER-SMT_3_1-NC_TRACE
footprint JUMPER_3_2-NC_TRACE_SILK (SMT-JUMPER_3_2-NC_TRACE_SILK)
pins: 1, 2, 3

## KLD-0202-B
designator J?
Low Voltage Power Supply Connector; Manufacturer: Kycon; AEMS Code: 3510211
3D model power_jack (PCB3D Model)
footprint KLD-0202
pins: 1 (power), 2 (power), 3 (power)

## L
designator ?
footprint 6000
pins: 1, 2

## L1800R
designator ?
footprint 1800R
pins: 1, 2

## L2474/10
designator ?
footprint 2747
pins: P$1 1, P$2 2

## LASSENIQ
designator ?
footprint TRIMBLE
pins: 1 TX (out), 2 GND1 (oe), 3 RX, 4 PPS (out), 5 TX2 (out), 6 RX2, 7 VCC (oe), 8 BAT (oe)

## LCD1202
designator LED?, comment NOKIA 1202
footprint LCD1202
pins: 1 RST, 2 CS, 3 MOSI, 4 SCK, 5 VCC, 6 GND, 7 LED

## LDR_4mm
designator LED?, comment LED   OSRAM: - CHIPLED LG R971, LG N971, LY N971, LG Q971, LY Q971, LO R971, LY R971 LH N974, LH R974 LS Q976, LO Q976, LY Q976 LO Q996 - Hyper CHIPLED LW Q18S LB Q993, LB Q99A, LB R99A - SideLED LS A670, LO A670, LY A670, LG A670, LP A670 LB A673, LV A673, LT A673, LW A673 LH A674 LY A675 LS A676, LA A676, LO A676, LY A676, LW A676 LS A679, LY A679, LG A679 -  Hyper Micro SIDELEDÂ® LS Y876, LA Y876, LO Y876, LY Y876 LT Y87S - SmartLED LW L88C, LW L88S LB L89C, LB L89S, LG L890 LS L89K, LO L89K, LY L89K LS L896, LA L896, LO L896, LY L896 - TOPLED LS T670, LO T670, LY T670, LG T670, LP T670 LSG T670, LSP T670, LSY T670, LOP T670, LYG T670 LG T671, LOG T671, LSG T671 LB T673, LV T673, LT T673, LW T673 LH T674 LS T676, LA T676, LO T676, LY T676, LB T676, LH T676, LSB T676, LW T676 LB T67C, LV T67C, LT T67C, LS T67K, LO T67K, LY T67K, LW E67C LS E67B, LA E67B, LO E67B, LY E67B, LB E67C, LV E67C, LT E67C LW T67C LS T679, LY T679, LG T679 LS T770, LO T770, LY T770, LG T770, LP T770 LB T773, LV T773, LT T773, LW T773 LH T774 LS E675, LA E675, LY E675, LS T675 LS T776, LA T776, LO T776, LY T776, LB T776 LHGB T686 LT T68C, LB T68C - Hyper Mini TOPLEDÂ® LB M676 - Mini TOPLED SantanaÂ® LG M470 LS M47K, LO M47K, LY M47K    Source: http://www.osram.convergy.de/
footprint LDR-4mm
pins: 1, 2

## LED3MM
designator LED?, comment LED   OSRAM: - CHIPLED LG R971, LG N971, LY N971, LG Q971, LY Q971, LO R971, LY R971 LH N974, LH R974 LS Q976, LO Q976, LY Q976 LO Q996 - Hyper CHIPLED LW Q18S LB Q993, LB Q99A, LB R99A - SideLED LS A670, LO A670, LY A670, LG A670, LP A670 LB A673, LV A673, LT A673, LW A673 LH A674 LY A675 LS A676, LA A676, LO A676, LY A676, LW A676 LS A679, LY A679, LG A679 -  Hyper Micro SIDELEDÂ® LS Y876, LA Y876, LO Y876, LY Y876 LT Y87S - SmartLED LW L88C, LW L88S LB L89C, LB L89S, LG L890 LS L89K, LO L89K, LY L89K LS L896, LA L896, LO L896, LY L896 - TOPLED LS T670, LO T670, LY T670, LG T670, LP T670 LSG T670, LSP T670, LSY T670, LOP T670, LYG T670 LG T671, LOG T671, LSG T671 LB T673, LV T673, LT T673, LW T673 LH T674 LS T676, LA T676, LO T676, LY T676, LB T676, LH T676, LSB T676, LW T676 LB T67C, LV T67C, LT T67C, LS T67K, LO T67K, LY T67K, LW E67C LS E67B, LA E67B, LO E67B, LY E67B, LB E67C, LV E67C, LT E67C LW T67C LS T679, LY T679, LG T679 LS T770, LO T770, LY T770, LG T770, LP T770 LB T773, LV T773, LT T773, LW T773 LH T774 LS E675, LA E675, LY E675, LS T675 LS T776, LA T776, LO T776, LY T776, LB T776 LHGB T686 LT T68C, LB T68C - Hyper Mini TOPLEDÂ® LB M676 - Mini TOPLED SantanaÂ® LG M470 LS M47K, LO M47K, LY M47K    Source: http://www.osram.convergy.de/
footprint LED3MM
pins: A, K

## LED5MM
designator LED?
footprint LED5MM
footprint LED5MM1
pins: A, K

## LED5MM_REC
designator LED?
footprint LED5MM
footprint LED5MM1
pins: A, K

## LED-DUAL -0603
designator D?
0603 1.6*1.5mm; MF: Lucky Light; MP: LL-R3528RGBC-008-B; Package: PLCC-2 Lucky Light; Availability: Unavailable; Value: *; SnapEDA_Link: https://www.snapeda.com/parts/LL-R3528RGBC-008-B/Lucky%20Light/view-part/47649/?ref=snap; Price: None
footprint LED_DUAL_0606 - touch
footprint LED_DUAL_0606
pins: 1 A, 2 A, 3 K, 4 K
text: R; B

## LED-LL-R3528RGBC-008-B
designator D?
LED; SMD; 3528, PLCC2; RGB; 3.5x2.8mm; 120Â°; Red lumin: 1; MF: Lucky Light; MP: LL-R3528RGBC-008-B; Package: PLCC-2 Lucky Light; Availability: Unavailable; Value: *; SnapEDA_Link: https://www.snapeda.com/parts/LL-R3528RGBC-008-B/Lucky%20Light/view-part/47649/?ref=snap; Price: None
footprint LED_LL-R3528RGBC-008-B
pins: 1 A, 2 K, 3 K, 4 K
text: R; B; G

## LED-SK6812MINI-E
designator D?  Name: SK6812MINI-E
SMD RGB LED
footprint LED_SK6812MINI-E
pins: 1 VDD, 2 DOUT (out), 3 VSS, 4 DIN (in)

## LED-SMT_LED_0603
designator LED?, comment BLUE
SMT LED
footprint CHIPLED_0603
pins: A, C K

## LED_SMD
designator LED?, comment LED   OSRAM: - CHIPLED LG R971, LG N971, LY N971, LG Q971, LY Q971, LO R971, LY R971 LH N974, LH R974 LS Q976, LO Q976, LY Q976 LO Q996 - Hyper CHIPLED LW Q18S LB Q993, LB Q99A, LB R99A - SideLED LS A670, LO A670, LY A670, LG A670, LP A670 LB A673, LV A673, LT A673, LW A673 LH A674 LY A675 LS A676, LA A676, LO A676, LY A676, LW A676 LS A679, LY A679, LG A679 -  Hyper Micro SIDELEDÂ® LS Y876, LA Y876, LO Y876, LY Y876 LT Y87S - SmartLED LW L88C, LW L88S LB L89C, LB L89S, LG L890 LS L89K, LO L89K, LY L89K LS L896, LA L896, LO L896, LY L896 - TOPLED LS T670, LO T670, LY T670, LG T670, LP T670 LSG T670, LSP T670, LSY T670, LOP T670, LYG T670 LG T671, LOG T671, LSG T671 LB T673, LV T673, LT T673, LW T673 LH T674 LS T676, LA T676, LO T676, LY T676, LB T676, LH T676, LSB T676, LW T676 LB T67C, LV T67C, LT T67C, LS T67K, LO T67K, LY T67K, LW E67C LS E67B, LA E67B, LO E67B, LY E67B, LB E67C, LV E67C, LT E67C LW T67C LS T679, LY T679, LG T679 LS T770, LO T770, LY T770, LG T770, LP T770 LB T773, LV T773, LT T773, LW T773 LH T774 LS E675, LA E675, LY E675, LS T675 LS T776, LA T776, LO T776, LY T776, LB T776 LHGB T686 LT T68C, LB T68C - Hyper Mini TOPLEDÂ® LB M676 - Mini TOPLED SantanaÂ® LG M470 LS M47K, LO M47K, LY M47K    Source: http://www.osram.convergy.de/  (value not drawn)
footprint CHIPLED_0603
pins: A, A, A, A, C K, C K, C K, C K

## LEDCHIP-LED0603
designator LED?, comment LED  (value not drawn)
SMD lamp beads
footprint CHIP-LED0603
footprint CHIPLED_0603
footprint KA-3528ASYC
footprint CHIPLED_0603 - NO
pins: A, C K

## LEDCHIP-LED0805
designator D?  (value not drawn)
SMD Lamp beads
footprint CHIP-LED0805
footprint CHIP-LED0805-NO
pins: A, C

## LEDCHIP_LED1206
designator LED?, comment LED   OSRAM: - CHIPLED LG R971, LG N971, LY N971, LG Q971, LY Q971, LO R971, LY R971 LH N974, LH R974 LS Q976, LO Q976, LY Q976 LO Q996 - Hyper CHIPLED LW Q18S LB Q993, LB Q99A, LB R99A - SideLED LS A670, LO A670, LY A670, LG A670, LP A670 LB A673, LV A673, LT A673, LW A673 LH A674 LY A675 LS A676, LA A676, LO A676, LY A676, LW A676 LS A679, LY A679, LG A679 -  Hyper Micro SIDELEDÂ® LS Y876, LA Y876, LO Y876, LY Y876 LT Y87S - SmartLED LW L88C, LW L88S LB L89C, LB L89S, LG L890 LS L89K, LO L89K, LY L89K LS L896, LA L896, LO L896, LY L896 - TOPLED LS T670, LO T670, LY T670, LG T670, LP T670 LSG T670, LSP T670, LSY T670, LOP T670, LYG T670 LG T671, LOG T671, LSG T671 LB T673, LV T673, LT T673, LW T673 LH T674 LS T676, LA T676, LO T676, LY T676, LB T676, LH T676, LSB T676, LW T676 LB T67C, LV T67C, LT T67C, LS T67K, LO T67K, LY T67K, LW E67C LS E67B, LA E67B, LO E67B, LY E67B, LB E67C, LV E67C, LT E67C LW T67C LS T679, LY T679, LG T679 LS T770, LO T770, LY T770, LG T770, LP T770 LB T773, LV T773, LT T773, LW T773 LH T774 LS E675, LA E675, LY E675, LS T675 LS T776, LA T776, LO T776, LY T776, LB T776 LHGB T686 LT T68C, LB T68C - Hyper Mini TOPLEDÂ® LB M676 - Mini TOPLED SantanaÂ® LG M470 LS M47K, LO M47K, LY M47K    Source: http://www.osram.convergy.de/
footprint CHIPLED_1206
pins: A, C

## LIST-1x2_ANG
designator P?, comment Pin List 1x2, Angled
Pin List 1x2, 2.54mm (100mil), Right Angled, SMD; Part Number: Pin List Ang 1x2 SMD, 2.54mm; Manufacturer: W-CON; Manufacturer Part Number: 1125B-1102S0ZZ135R1; 2nd source part number: TSM-102-01-L-SH-A; Artikkelnr Noca: 55010023; Artikkelnr Simpro: N.A.; Datasheet: \\hizz\pro\app9717\Datasheet\connectores\W-CON\1125B-11XXXXZXXXXX.pdf; Footprint Doc: LIST_ANG_1x2-SMD-2.54MM; LatestRevisionDate: 2016-01-22; Pin Count: 2; Publisher: Nordic Semiconductor; Published: 2016-01-22; Value: Pin List 1x2, Angled; Note: *; Supplier: Cabcon; Supplier part number: 1125B-1102S0ZZ135R1; 2nd source Supplier: Samtec
footprint LIST_ANG_1x2-SMD-2.54MM
pins: 1, 2

## LIST-1x6
designator P?, comment Pin List 1x6
Pin List 1x6, 2.54mm (100mil), SMD; Part Number: Pin List 1x6 SMD; Note: Not mounted; Artikkelnr Noca: 55019252; Artikkelnr Simpro: N.A.; Manufacturer: *; Manufacturer Part Number: *; Datasheet: *; LatestRevisionDate: 2013-08-27; Pin Count: 6; Publisher: Nordic Semiconductor; Published: 2013-08-27; Value: Pin List 1x6; Supplier: Samtec; Supplier part number: TSM-106-01-L-SV-P-TR; 2nd source Supplier: *; 2nd source part number: *; Footprint Doc: LIST_1x6_SMD
footprint LIST_1x6_SMD
pins: 1, 2, 3 (power), 4 (power), 5 (power), 6 (power)

## LIST-1x8
designator P?, comment Pin List 1x8
Pin List 1x8, 2.54mm (100mil), SMD; Part Number: Pin List 1x8 SMD; Note: Not mounted; Artikkelnr Noca: 55019253; Artikkelnr Simpro: N.A.; Manufacturer: *; Manufacturer Part Number: *; Datasheet: *; LatestRevisionDate: 2013-08-27; Publisher: Nordic Semiconductor; Published: 2013-08-27; Value: Pin List 1x8; Supplier: Samtec; Supplier part number: TSM-108-01-L-SV-P-TR; 2nd source Supplier: *; 2nd source part number: *; Pin Count: 8; Footprint Doc: LIST_1x8_SMD
footprint LIST_1x8_SMD
pins: 1, 2, 3 (power), 4 (power), 5 (power), 6 (power), 7 (power), 8 (power)

## LIST-1x9
designator P?, comment Pin List 1x9
Pin List 1x9, 2.54mm (100mil), SMD; Part Number: Pin List 1x9 SMD; Artikkelnr Noca: N.A.; Manufacturer: *; Manufacturer Part Number: *; Datasheet: *; Footprint Doc: LIST_1x9_SMD; LatestRevisionDate: 2014-06-10; Pin Count: 9; Publisher: Nordic Semiconductor; Published: 2014-06-10; Value: Pin List 1x9; Note: *; Supplier: Samtec; Supplier part number: TSM-109-01-L-SV-P-TR; 2nd source Supplier: *; 2nd source part number: *; Artikkelnr Simpro: N.A.
footprint LIST_1x9_SMD
pins: 1, 2, 3 (power), 4 (power), 5 (power), 6 (power), 7 (power), 8 (power), 9 (power)

## LIST-1x10
designator P?, comment Pin List 1x10
Pin List 1x10, 2.54mm (100mil), SMD; Part Number: Pin List 1x10 SMD; Note: Not mounted; Artikkelnr Noca: 55019254; Artikkelnr Simpro: N.A.; Manufacturer: *; Manufacturer Part Number: *; Datasheet: *; LatestRevisionDate: 2013-08-27; Publisher: Nordic Semiconductor; Published: 2013-08-27; Value: Pin List 1x10; Supplier: Samtec; Supplier part number: TSM-110-01-L-SV-P-TR; 2nd source Supplier: *; 2nd source part number: *; Pin Count: 10; Footprint Doc: LIST_1x10_SMD
footprint LIST_1x10_SMD
pins: 1, 2, 3, 4, 5, 6, 7, 8, 9, 10

## LM324
designator U?  (value not drawn)
Quad Operational Amplifiers
footprint TSSOP14
footprint SOIC127P600X175-14N
part A pins: 1 OA (out), 2 A- (in), 3 A+ (in), 4 VCC, 11 GND
part B pins: 5 B+ (in), 6 B- (in), 7 OB (out)
part C pins: 8 OC (out), 9 C- (in), 10 C+ (in)
part D pins: 12 D+ (in), 13 D- (in), 14 OD (out)